# Altium footprint library MyPcbLib.PcbLib: 222 footprints (part 2 of 14)
Each footprint in its own frame and in the unit in brackets; x right, y up, seen from the top. Pads: shape width x height; smd on the part's side, far side on the other; paste and mask are expansions set on the pad; w line width, h text height; cw(c..) or ccw(c..) is an arc to the next point about the centre after c.
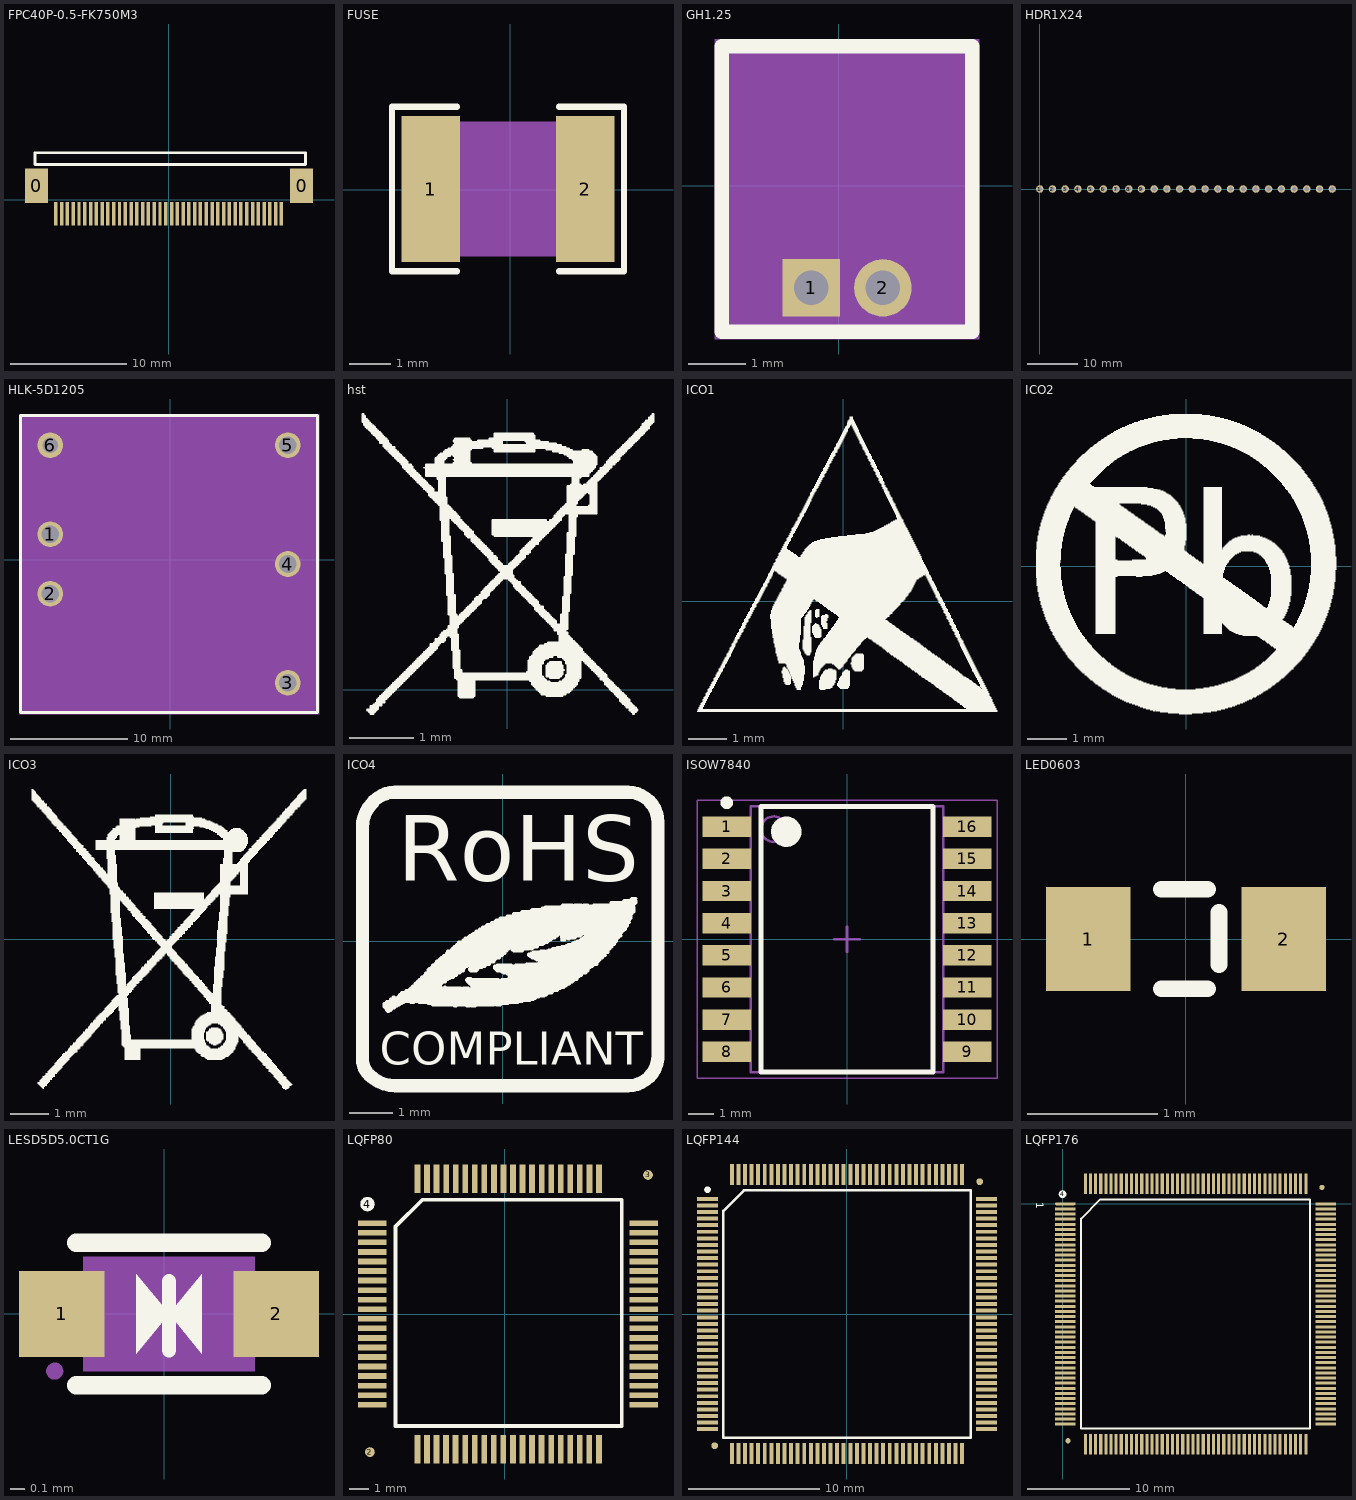
[diagram p1: the footprints below, top view; thin cyan lines are the x and y axes]

## FPC40P-0.5-FK750M3 [mm]
pads (42):
  rect 2x3 smd: 0(-11.465,1.202) 0(11.465,1.202)
  rect 0.3x2 smd: 1(9.721,-1.202) 2(9.221,-1.202) 3(8.721,-1.202) 4(8.221,-1.202) 5(7.721,-1.202) 6(7.221,-1.202) 7(6.721,-1.202) 8(6.221,-1.202) 9(5.721,-1.202) 10(5.221,-1.202) 11(4.721,-1.202) 12(4.221,-1.202) 13(3.721,-1.202) 14(3.221,-1.202) 15(2.721,-1.202) 16(2.221,-1.202) 17(1.721,-1.202) 18(1.221,-1.202) 19(0.721,-1.202) 20(0.221,-1.202) 21(-0.279,-1.202) 22(-0.779,-1.202) 23(-1.279,-1.202) 24(-1.779,-1.202) 25(-2.279,-1.202) 26(-2.779,-1.202) 27(-3.279,-1.202) 28(-3.779,-1.202) 29(-4.279,-1.202) 30(-4.779,-1.202) 31(-5.279,-1.202) 32(-5.779,-1.202) 33(-6.279,-1.202) 34(-6.779,-1.202) 35(-7.279,-1.202) 36(-7.779,-1.202) 37(-8.279,-1.202) 38(-8.779,-1.202) 39(-9.279,-1.202) 40(-9.779,-1.202)
Top Overlay:
  lines w0.254: -11.585,3.049 -11.585,4.065 11.815,4.065 11.815,3.049 -11.585,3.049
3D body "User Library-FPC-40-2.STEP": height 1.95, standoff 0, extent -12.23,-1.755 12.17,4.545

## FUSE [mm]
pads (2):
  rect 1.407x3.499 smd: 1(-1.913,0.022) 2(1.794,0.022)
Top Overlay:
  lines w0.152: -1.286,-1.956 -2.845,-1.956 -2.845,2.001 -1.286,2.001 ; 1.167,-1.956 2.726,-1.956 2.726,2.001 1.167,2.001
Top Paste:
  region: -1.21,-1.627 -1.21,-0.672 -1.31,-0.572 -1.588,-0.572 -1.688,-0.472 -1.688,0.517 -1.588,0.617 -1.31,0.617 -1.21,0.717 -1.21,1.672 -1.31,1.772 -2.516,1.772 -2.616,1.672 -2.616,-1.627 -2.516,-1.727 -1.31,-1.727
  region: 1.09,-1.627 1.09,-0.672 1.19,-0.572 1.469,-0.572 1.569,-0.472 1.569,0.517 1.469,0.617 1.19,0.617 1.09,0.717 1.09,1.672 1.19,1.772 2.397,1.772 2.497,1.672 2.497,-1.627 2.397,-1.727 1.19,-1.727
Mechanical 4:
  region: -2.335,-1.598 -2.335,1.642 2.215,1.642 2.215,-1.598
Mechanical 5:
  region: 2.215,-1.598 2.215,1.642 1.465,1.642 1.465,-1.598
  region: -2.335,-1.598 -2.335,1.642 -1.585,1.642 -1.585,-1.598
Mechanical 6:
  circle w0.06: c-2.335,-1.598 r0.03
Mechanical 15:
  lines w0.003: -0.085,0.399 -0.034,0.449

## GH1.25 [mm]
pads (2):
  rect 1x1 hole 0.6: 1(-0.482,-1.778)
  round 1 hole 0.6: 2(0.768,-1.778)
Top Overlay:
  lines w0.254: -2.032,-2.54 -2.032,2.422 2.318,2.422 2.318,-2.54 -2.032,-2.54
Mechanical 4:
  region: -2.159,2.549 2.445,2.549 2.445,-2.667 -2.159,-2.667
Mechanical 5:
  region: 0.268,-1.278 1.268,-1.278 1.268,-2.278 0.268,-2.278
  region: -0.982,-1.278 0.018,-1.278 0.018,-2.278 -0.982,-2.278
Mechanical 15:
  lines w0.003: 0.118,0.387 0.168,0.438

## HDR1X24 [mm] "Connector; Header; 24 Position"
pads (24):
  round 1.5 hole 0.9: 1(0,0) 2(2.54,0) 3(5.08,0) 4(7.62,0) 5(10.16,0) 6(12.7,0) 7(15.24,0) 8(17.78,0) 9(20.32,0) 10(22.86,0) 11(25.4,0) 12(27.94,0) 13(30.48,0) 14(33.02,0) 15(35.56,0) 16(38.1,0) 17(40.64,0) 18(43.18,0) 19(45.72,0) 20(48.26,0) 21(50.8,0) 22(53.34,0) 23(55.88,0) 24(58.42,0)

## HLK-5D1205 [mil]
pads (6):
  round 86.61 hole 59.06: 1(-405,85) 2(-405,-115) 3(395,-415) 4(395,-15) 5(395,385)
  round 86.61 hole 52: 6(-405,385)
Top Overlay:
  lines w10: -505,-515 -505,485 495,485 495,-515 -505,-515
Mechanical 4:
  region: -510,490 500,490 500,-520 -510,-520
Mechanical 5:
  region: 351.69,28.31 438.31,28.31 438.31,-58.31 351.69,-58.31
  region: 351.69,-371.69 438.31,-371.69 438.31,-458.31 351.69,-458.31
  region: 351.69,428.31 438.31,428.31 438.31,341.69 351.69,341.69
  region: -448.31,428.31 -361.69,428.31 -361.69,341.69 -448.31,341.69
  region: -448.31,-71.69 -361.69,-71.69 -361.69,-158.31 -448.31,-158.31
  region: -448.31,128.31 -361.69,128.31 -361.69,41.69 -448.31,41.69
Mechanical 15:
  lines w0.1: -6,2.75 -4,4.75

## hst [mm]
Top Overlay:
  drawing of 1279 lines, arcs and shapes, not listed

## ICO1 [mm]
Top Overlay:
  drawing of 990 lines, arcs and shapes, not listed

## ICO2 [mm]
Top Overlay:
  drawing of 960 lines, arcs and shapes, not listed

## ICO3 [mm]
Top Overlay:
  drawing of 1026 lines, arcs and shapes, not listed

## ICO4 [mm]
Top Overlay:
  drawing of 1541 lines, arcs and shapes, not listed
  text "COMPLIANT" at -2.845,-2.869 h0.76
  text "RoHS" at -2.438,1.398 h1.52

## ISOW7840 [mm] "SOIC, 16-Leads, Body 10.30x7.50mm, Pitch 1.27mm, IPC Medium Density"
height 2.65
pads (16):
  rect 1.9x0.8 smd: 1(-4.75,4.445) 2(-4.75,3.175) 3(-4.75,1.905) 4(-4.75,0.635) 5(-4.75,-0.635) 6(-4.75,-1.905) 7(-4.75,-3.175) 8(-4.75,-4.445) 9(4.75,-4.445) 10(4.75,-3.175) 11(4.75,-1.905) 12(4.75,-0.635) 13(4.75,0.635) 14(4.75,1.905) 15(4.75,3.175) 16(4.75,4.445)
Top Overlay:
  circle w0.25: c-4.75,5.395 r0.125
  circle w0.6: c-2.4,4.25 r0.3
  lines w0.2: -3.4,-5.25 -3.4,5.25 3.4,5.25 3.4,-5.25 -3.4,-5.25
Mechanical 2:
  circle w0.1: c-2.9,4.35 r0.5
  lines w0.1: -3.8,-5.25 -3.8,5.25 3.8,5.25 3.8,-5.25 -3.8,-5.25
Mechanical 6:
  lines w0.05: -5.925,-5.5 -5.925,5.5 5.925,5.5 5.925,-5.5 -5.925,-5.5
  lines w0.1: -0.5,0 0.5,0 ; 0,-0.5 0,0.5
3D body: height 2.65, standoff 0.1, extent -3.8,-5.25 3.8,5.25

## LED0603 [mm]
pads (2):
  rect 0.65x0.8 smd: 1(-0.75,0) 2(0.75,0)
Top Overlay:
  lines w0.127: -0.19,-0.383 0.165,-0.383 ; -0.19,0.383 0.165,0.383 ; 0.253,-0.196 0.253,0.204
3D body "LED-0603.STEP": height 0.52, standoff -0.03, extent -0.851,-0.387 0.8,0.413

## LESD5D5.0CT1G [mm]
pads (2):
  rect 0.6x0.6 smd: 1(-0.716,0) 2(0.784,0)
Top Overlay:
  region: 0.034,0 -0.195,-0.279 -0.195,0.279
  region: 0.034,0 0.263,0.279 0.263,-0.279
  lines w0.1: 0.034,-0.254 0.034,0.229
  lines w0.13: -0.616,-0.5 0.684,-0.5 ; -0.616,0.5 0.684,0.5
Mechanical 4:
  region: -0.566,-0.4 -0.566,0.4 0.634,0.4 0.634,-0.4
Mechanical 5:
  region: -0.766,0.15 -0.429,0.15 -0.429,-0.15 -0.766,-0.15
  region: 0.834,-0.152 0.497,-0.152 0.497,0.148 0.834,0.148
Mechanical 6:
  circle w0.06: c-0.766,-0.4 r0.03
Mechanical 15:
  region: 0.263,0.279 0.263,-0.279 0.034,0
  region: -0.195,0.279 -0.195,-0.279 0.034,0

## LQFP80 [mm]
pads (83):
  rect 1.5x0.3 smd: 1(-6.934,4.763) 2(-6.934,4.263) 3(-6.934,3.763) 4(-6.934,3.263) 5(-6.934,2.763) 6(-6.934,2.263) 7(-6.934,1.763) 8(-6.934,1.263) 9(-6.934,0.763) 10(-6.934,0.263) 11(-6.934,-0.237) 12(-6.934,-0.737) 13(-6.934,-1.237) 14(-6.934,-1.737) 15(-6.934,-2.237) 16(-6.934,-2.737) 17(-6.934,-3.237) 18(-6.934,-3.737) 19(-6.934,-4.237) 20(-6.934,-4.737) 41(7.266,-4.737) 42(7.266,-4.237) 43(7.266,-3.737) 44(7.266,-3.237) 45(7.266,-2.737) 46(7.266,-2.237) 47(7.266,-1.737) 48(7.266,-1.237) 49(7.266,-0.737) 50(7.266,-0.237) 51(7.266,0.263) 52(7.266,0.763) 53(7.266,1.263) 54(7.266,1.763) 55(7.266,2.263) 56(7.266,2.763) 57(7.266,3.263) 58(7.266,3.763) 59(7.266,4.263) 60(7.266,4.763)
  round 0.508 smd: 2(-7.061,-7.214) 3(7.493,7.29)
  round 0.762 on Top Overlay: 4(-7.188,5.766)
  rect 0.3x1.5 smd: 21(-4.576,-7.074) 22(-4.076,-7.074) 23(-3.576,-7.074) 24(-3.076,-7.074) 25(-2.576,-7.074) 26(-2.076,-7.074) 27(-1.576,-7.074) 28(-1.076,-7.074) 29(-0.576,-7.074) 30(-0.076,-7.074) 31(0.424,-7.074) 32(0.924,-7.074) 33(1.424,-7.074) 34(1.924,-7.074) 35(2.424,-7.074) 36(2.924,-7.074) 37(3.424,-7.074) 38(3.924,-7.074) 39(4.424,-7.074) 40(4.924,-7.074) 61(4.928,7.099) 62(4.428,7.099) 63(3.928,7.099) 64(3.428,7.099) 65(2.928,7.099) 66(2.428,7.099) 67(1.928,7.099) 68(1.428,7.099) 69(0.928,7.099) 70(0.428,7.099) 71(-0.072,7.099) 72(-0.572,7.099) 73(-1.072,7.099) 74(-1.572,7.099) 75(-2.072,7.099) 76(-2.572,7.099) 77(-3.072,7.099) 78(-3.572,7.099) 79(-4.072,7.099) 80(-4.572,7.099)
Top Overlay:
  lines w0.2: -5.715,-5.855 6.121,-5.855 6.121,5.994 -4.305,5.994 -5.715,4.585 -5.715,-5.855
3D body "LQFP-80.step": height 1.73, standoff 0.09, extent -6.936,-7.087 7.264,7.113

## LQFP144 [mm]
pads (146):
  rect 1.6x0.3 smd: 1(-10.6,8.75) 2(-10.6,8.25) 3(-10.6,7.75) 4(-10.6,7.25) 5(-10.6,6.75) 6(-10.6,6.25) 7(-10.6,5.75) 8(-10.6,5.25) 9(-10.6,4.75) 10(-10.6,4.25) 11(-10.6,3.75) 12(-10.6,3.25) 13(-10.6,2.75) 14(-10.6,2.25) 15(-10.6,1.75) 16(-10.6,1.25) 17(-10.6,0.75) 18(-10.6,0.25) 19(-10.6,-0.25) 20(-10.6,-0.75) 21(-10.6,-1.25) 22(-10.6,-1.75) 23(-10.6,-2.25) 24(-10.6,-2.75) 25(-10.6,-3.25) 26(-10.6,-3.75) 27(-10.6,-4.25) 28(-10.6,-4.75) 29(-10.6,-5.25) 30(-10.6,-5.75) 31(-10.6,-6.25) 32(-10.6,-6.75) 33(-10.6,-7.25) 34(-10.6,-7.75) 35(-10.6,-8.25) 36(-10.6,-8.75) 73(10.6,-8.75) 74(10.6,-8.25) 75(10.6,-7.75) 76(10.6,-7.25) 77(10.6,-6.75) 78(10.6,-6.25) 79(10.6,-5.75) 80(10.6,-5.25) 81(10.6,-4.75) 82(10.6,-4.25) 83(10.6,-3.75) 84(10.6,-3.25) 85(10.6,-2.75) 86(10.6,-2.25) 87(10.6,-1.75) 88(10.6,-1.25) 89(10.6,-0.75) 90(10.6,-0.25) 91(10.6,0.25) 92(10.6,0.75) 93(10.6,1.25) 94(10.6,1.75) 95(10.6,2.25) 96(10.6,2.75) 97(10.6,3.25) 98(10.6,3.75) 99(10.6,4.25) 100(10.6,4.75) 101(10.6,5.25) 102(10.6,5.75) 103(10.6,6.25) 104(10.6,6.75) 105(10.6,7.25) 106(10.6,7.75) 107(10.6,8.25) 108(10.6,8.75)
  round 0.508 smd: 6(10.084,10.058) 7(-10.058,-10.008)
  rect 0.3x1.6 smd: 37(-8.75,-10.6) 38(-8.25,-10.6) 39(-7.75,-10.6) 40(-7.25,-10.6) 41(-6.75,-10.6) 42(-6.25,-10.6) 43(-5.75,-10.6) 44(-5.25,-10.6) 45(-4.75,-10.6) 46(-4.25,-10.6) 47(-3.75,-10.6) 48(-3.25,-10.6) 49(-2.75,-10.6) 50(-2.25,-10.6) 51(-1.75,-10.6) 52(-1.25,-10.6) 53(-0.75,-10.6) 54(-0.25,-10.6) 55(0.25,-10.6) 56(0.75,-10.6) 57(1.25,-10.6) 58(1.75,-10.6) 59(2.25,-10.6) 60(2.75,-10.6) 61(3.25,-10.6) 62(3.75,-10.6) 63(4.25,-10.6) 64(4.75,-10.6) 65(5.25,-10.6) 66(5.75,-10.6) 67(6.25,-10.6) 68(6.75,-10.6) 69(7.25,-10.6) 70(7.75,-10.6) 71(8.25,-10.6) 72(8.75,-10.6) 109(8.75,10.6) 110(8.25,10.6) 111(7.75,10.6) 112(7.25,10.6) 113(6.75,10.6) 114(6.25,10.6) 115(5.75,10.6) 116(5.25,10.6) 117(4.75,10.6) 118(4.25,10.6) 119(3.75,10.6) 120(3.25,10.6) 121(2.75,10.6) 122(2.25,10.6) 123(1.75,10.6) 124(1.25,10.6) 125(0.75,10.6) 126(0.25,10.6) 127(-0.25,10.6) 128(-0.75,10.6) 129(-1.25,10.6) 130(-1.75,10.6) 131(-2.25,10.6) 132(-2.75,10.6) 133(-3.25,10.6) 134(-3.75,10.6) 135(-4.25,10.6) 136(-4.75,10.6) 137(-5.25,10.6) 138(-5.75,10.6) 139(-6.25,10.6) 140(-6.75,10.6) 141(-7.25,10.6) 142(-7.75,10.6) 143(-8.25,10.6) 144(-8.75,10.6)
Top Overlay:
  circle w0.25: c-10.6,9.45 r0.125
  lines w0.2: -9.4,-9.4 9.4,-9.4 9.4,9.4 -7.847,9.4 -9.4,7.847 -9.4,-9.4
3D body "TQFP144.STEP": height 1.1, standoff 0, extent -10.983,-11.009 11.034,11.009

## LQFP176 [mm]
pads (179):
  oval 2x0.3 smd: 1(0.254,0)
  rect 2x0.3 smd: 2(0.254,-0.5) 3(0.254,-1) 4(0.254,-1.5) 5(0.254,-2) 6(0.254,-2.5) 7(0.254,-3) 8(0.254,-3.5) 9(0.254,-4) 10(0.254,-4.5) 11(0.254,-5) 12(0.254,-5.5) 13(0.254,-6) 14(0.254,-6.5) 15(0.254,-7) 16(0.254,-7.5) 17(0.254,-8) 18(0.254,-8.5) 19(0.254,-9) 20(0.254,-9.5) 21(0.254,-10) 22(0.254,-10.5) 23(0.254,-11) 24(0.254,-11.5) 25(0.254,-12) 26(0.254,-12.5) 27(0.254,-13) 28(0.254,-13.5) 29(0.254,-14) 30(0.254,-14.5) 31(0.254,-15) 32(0.254,-15.5) 33(0.254,-16) 34(0.254,-16.5) 35(0.254,-17) 36(0.254,-17.5) 37(0.254,-18) 38(0.254,-18.5) 39(0.254,-19) 40(0.254,-19.5) 41(0.254,-20) 42(0.254,-20.5) 43(0.254,-21) 44(0.254,-21.5) 89(25.646,-21.5) 90(25.646,-21) 91(25.646,-20.5) 92(25.646,-20) 93(25.646,-19.5) 94(25.646,-19) 95(25.646,-18.5) 96(25.646,-18) 97(25.646,-17.5) 98(25.646,-17) 99(25.646,-16.5) 100(25.646,-16) 101(25.646,-15.5) 102(25.646,-15) 103(25.646,-14.5) 104(25.646,-14) 105(25.646,-13.5) 106(25.646,-13) 107(25.646,-12.5) 108(25.646,-12) 109(25.646,-11.5) 110(25.646,-11) 111(25.646,-10.5) 112(25.646,-10) 113(25.646,-9.5) 114(25.646,-9) 115(25.646,-8.5) 116(25.646,-8) 117(25.646,-7.5) 118(25.646,-7) 119(25.646,-6.5) 120(25.646,-6) 121(25.646,-5.5) 122(25.646,-5) 123(25.646,-4.5) 124(25.646,-4) 125(25.646,-3.5) 126(25.646,-3) 127(25.646,-2.5) 128(25.646,-2) 129(25.646,-1.5) 130(25.646,-1) 131(25.646,-0.5) 132(25.646,0)
  round 0.508 smd: 2(25.273,1.6) 3(0.508,-23.114)
  round 0.762 on Top Overlay: 4(-0.025,0.94)
  rect 0.3x2 smd: 45(2.2,-23.446) 46(2.7,-23.446) 47(3.2,-23.446) 48(3.7,-23.446) 49(4.2,-23.446) 50(4.7,-23.446) 51(5.2,-23.446) 52(5.7,-23.446) 53(6.2,-23.446) 54(6.7,-23.446) 55(7.2,-23.446) 56(7.7,-23.446) 57(8.2,-23.446) 58(8.7,-23.446) 59(9.2,-23.446) 60(9.7,-23.446) 61(10.2,-23.446) 62(10.7,-23.446) 63(11.2,-23.446) 64(11.7,-23.446) 65(12.2,-23.446) 66(12.7,-23.446) 67(13.2,-23.446) 68(13.7,-23.446) 69(14.2,-23.446) 70(14.7,-23.446) 71(15.2,-23.446) 72(15.7,-23.446) 73(16.2,-23.446) 74(16.7,-23.446) 75(17.2,-23.446) 76(17.7,-23.446) 77(18.2,-23.446) 78(18.7,-23.446) 79(19.2,-23.446) 80(19.7,-23.446) 81(20.2,-23.446) 82(20.7,-23.446) 83(21.2,-23.446) 84(21.7,-23.446) 85(22.2,-23.446) 86(22.7,-23.446) 87(23.2,-23.446) 88(23.7,-23.446) 133(23.7,1.946) 134(23.2,1.946) 135(22.7,1.946) 136(22.2,1.946) 137(21.7,1.946) 138(21.2,1.946) 139(20.7,1.946) 140(20.2,1.946) 141(19.7,1.946) 142(19.2,1.946) 143(18.7,1.946) 144(18.2,1.946) 145(17.7,1.946) 146(17.2,1.946) 147(16.7,1.946) 148(16.2,1.946) 149(15.7,1.946) 150(15.2,1.946) 151(14.7,1.946) 152(14.2,1.946) 153(13.7,1.946) 154(13.2,1.946) 155(12.7,1.946) 156(12.2,1.946) 157(11.7,1.946) 158(11.2,1.946) 159(10.7,1.946) 160(10.2,1.946) 161(9.7,1.946) 162(9.2,1.946) 163(8.7,1.946) 164(8.2,1.946) 165(7.7,1.946) 166(7.2,1.946) 167(6.7,1.946) 168(6.2,1.946) 169(5.7,1.946) 170(5.2,1.946) 171(4.7,1.946) 172(4.2,1.946) 173(3.7,1.946) 174(3.2,1.946) 175(2.7,1.946) 176(2.2,1.946)
Top Overlay:
  lines w0.2: 24.079,0.432 3.658,0.432 1.785,-1.441 1.785,-21.915 24.115,-21.915 24.115,0.415
  text "1" at -2.616,0.127 h0.76
3D body "TQFP176.STEP": height 1.1, standoff 0, extent -0.055,-23.753 25.963,2.265